# Altium schematic symbol library jlcpcb_2025_04_resistors_extended_0201.schlib: 1508 symbols (part 1 of 8) (continued)
## 0201WMF1502TEE
designator R?  Resistance: 15kΩ  (hidden comment: *)
Resistor, 15kΩ, ±1%, 50mW, 25V, ±200ppm/℃, -55℃~+155℃, SMD 0201; Manufacturer: Uniroyal; Manufacturer Part Number: 0201WMF1502TEE; Supplier 1: LCSC; Supplier Part Number 1: C473452; JLCPCB Part Number: C473452; Power Rating: 50mW; Category: Resistors; Package Size: 0201; JLCPCB Basic Part: Yes; Tolerance: ±1%; Voltage Rating: 25V; Temperature Coefficient: ±200ppm/℃; Temperature Rating: -55℃~+155℃; ComponentLink1Description: Datasheet; ComponentLink1URL: https://wmsc.lcsc.com/wmsc/upload/file/pdf/v2/lcsc/2205312145_UNI-ROYAL-Uniroyal-Elec-0201WMF1502TEE_C473452.pdf; ComponentLink2Description: JLCPCB Part URL; ComponentLink2URL: https://jlcpcb.com/partdetail/C473452
pins: 1, 2
1 alternate drawing of the same symbol

## 0201WMF1503TEE
designator R?  Resistance: 150kΩ  (hidden comment: *)
Resistor, 150kΩ, ±1%, 50mW, 25V, ±200ppm/℃, -55℃~+155℃, SMD 0201; Manufacturer: Uniroyal; Manufacturer Part Number: 0201WMF1503TEE; Supplier 1: LCSC; Supplier Part Number 1: C473465; JLCPCB Part Number: C473465; Power Rating: 50mW; Category: Resistors; Package Size: 0201; JLCPCB Basic Part: Yes; Tolerance: ±1%; Voltage Rating: 25V; Temperature Coefficient: ±200ppm/℃; Temperature Rating: -55℃~+155℃; ComponentLink1Description: Datasheet; ComponentLink1URL: https://wmsc.lcsc.com/wmsc/upload/file/pdf/v2/lcsc/2205312145_UNI-ROYAL-Uniroyal-Elec-0201WMF1503TEE_C473465.pdf; ComponentLink2Description: JLCPCB Part URL; ComponentLink2URL: https://jlcpcb.com/partdetail/C473465
pins: 1, 2
1 alternate drawing of the same symbol

## 0201WMF1581TCE
designator R?  Resistance: 1.58kΩ  (hidden comment: *)
Resistor, 1.58kΩ, ±1%, 50mW, 25V, ±200ppm/℃, -55℃~+155℃, SMD 0201; Manufacturer: Uniroyal; Manufacturer Part Number: 0201WMF1581TCE; Supplier 1: LCSC; Supplier Part Number 1: C270790; JLCPCB Part Number: C270790; Power Rating: 50mW; Category: Resistors; Package Size: 0201; JLCPCB Basic Part: Yes; Tolerance: ±1%; Voltage Rating: 25V; Temperature Coefficient: ±200ppm/℃; Temperature Rating: -55℃~+155℃; ComponentLink1Description: Datasheet; ComponentLink1URL: https://wmsc.lcsc.com/wmsc/upload/file/pdf/v2/lcsc/2205312300_UNI-ROYAL-Uniroyal-Elec-0201WMF1581TCE_C270790.pdf; ComponentLink2Description: JLCPCB Part URL; ComponentLink2URL: https://jlcpcb.com/partdetail/C270790
pins: 1, 2
1 alternate drawing of the same symbol

## 0201WMF1602TEE
designator R?  Resistance: 16000Ω  (hidden comment: *)
Resistor, 16000Ω, ±1%, 50mW, 25V, ±200ppm/℃, -55℃~+155℃, SMD 0201; Manufacturer: Uniroyal; Manufacturer Part Number: 0201WMF1602TEE; Supplier 1: LCSC; Supplier Part Number 1: C423715; JLCPCB Part Number: C423715; Power Rating: 50mW; Category: Resistors; Package Size: 0201; JLCPCB Basic Part: Yes; Tolerance: ±1%; Voltage Rating: 25V; Temperature Coefficient: ±200ppm/℃; Temperature Rating: -55℃~+155℃; ComponentLink1Description: Datasheet; ComponentLink1URL: https://wmsc.lcsc.com/wmsc/upload/file/pdf/v2/lcsc/2205312030_UNI-ROYAL-Uniroyal-Elec-0201WMF1602TEE_C423715.pdf; ComponentLink2Description: JLCPCB Part URL; ComponentLink2URL: https://jlcpcb.com/partdetail/C423715
pins: 1, 2
1 alternate drawing of the same symbol

## 0201WMF1603TEE
designator R?  Resistance: 160000Ω  (hidden comment: *)
Resistor, 160000Ω, ±1%, 50mW, 25V, ±200ppm/℃, -55℃~+155℃, SMD 0201; Manufacturer: Uniroyal; Manufacturer Part Number: 0201WMF1603TEE; Supplier 1: LCSC; Supplier Part Number 1: C423714; JLCPCB Part Number: C423714; Power Rating: 50mW; Category: Resistors; Package Size: 0201; JLCPCB Basic Part: Yes; Tolerance: ±1%; Voltage Rating: 25V; Temperature Coefficient: ±200ppm/℃; Temperature Rating: -55℃~+155℃; ComponentLink1Description: Datasheet; ComponentLink1URL: https://wmsc.lcsc.com/wmsc/upload/file/pdf/v2/lcsc/2205312145_UNI-ROYAL-Uniroyal-Elec-0201WMF1603TEE_C423714.pdf; ComponentLink2Description: JLCPCB Part URL; ComponentLink2URL: https://jlcpcb.com/partdetail/C423714
pins: 1, 2
1 alternate drawing of the same symbol

## 0201WMF1621TEE
designator R?  Resistance: 1.62kΩ  (hidden comment: *)
Resistor, 1.62kΩ, ±1%, 50mW, 25V, ±200ppm/℃, -55℃~+155℃, SMD 0201; Manufacturer: Uniroyal; Manufacturer Part Number: 0201WMF1621TEE; Supplier 1: LCSC; Supplier Part Number 1: C423711; JLCPCB Part Number: C423711; Power Rating: 50mW; Category: Resistors; Package Size: 0201; JLCPCB Basic Part: Yes; Tolerance: ±1%; Voltage Rating: 25V; Temperature Coefficient: ±200ppm/℃; Temperature Rating: -55℃~+155℃; ComponentLink1Description: Datasheet; ComponentLink1URL: https://wmsc.lcsc.com/wmsc/upload/file/pdf/v2/lcsc/2205312145_UNI-ROYAL-Uniroyal-Elec-0201WMF1621TEE_C423711.pdf; ComponentLink2Description: JLCPCB Part URL; ComponentLink2URL: https://jlcpcb.com/partdetail/C423711
pins: 1, 2
1 alternate drawing of the same symbol

## 0201WMF1622TEE
designator R?  Resistance: 16.2kΩ  (hidden comment: *)
Resistor, 16.2kΩ, ±1%, 50mW, 25V, ±200ppm/℃, -55℃~+155℃, SMD 0201; Manufacturer: Uniroyal; Manufacturer Part Number: 0201WMF1622TEE; Supplier 1: LCSC; Supplier Part Number 1: C784128; JLCPCB Part Number: C784128; Power Rating: 50mW; Category: Resistors; Package Size: 0201; JLCPCB Basic Part: Yes; Tolerance: ±1%; Voltage Rating: 25V; Temperature Coefficient: ±200ppm/℃; Temperature Rating: -55℃~+155℃; ComponentLink1Description: Datasheet; ComponentLink1URL: https://wmsc.lcsc.com/wmsc/upload/file/pdf/v2/lcsc/2205312045_UNI-ROYAL-Uniroyal-Elec-0201WMF1622TEE_C784128.pdf; ComponentLink2Description: JLCPCB Part URL; ComponentLink2URL: https://jlcpcb.com/partdetail/C784128
pins: 1, 2
1 alternate drawing of the same symbol

## 0201WMF1624TEE
designator R?  Resistance: 1.62MΩ  (hidden comment: *)
Resistor, 1.62MΩ, ±1%, 50mW, 25V, ±200ppm/℃, -55℃~+155℃, SMD 0201; Manufacturer: Uniroyal; Manufacturer Part Number: 0201WMF1624TEE; Supplier 1: LCSC; Supplier Part Number 1: C423710; JLCPCB Part Number: C423710; Power Rating: 50mW; Category: Resistors; Package Size: 0201; JLCPCB Basic Part: Yes; Tolerance: ±1%; Voltage Rating: 25V; Temperature Coefficient: ±200ppm/℃; Temperature Rating: -55℃~+155℃; ComponentLink1Description: Datasheet; ComponentLink1URL: https://wmsc.lcsc.com/wmsc/upload/file/pdf/v2/lcsc/2205312030_UNI-ROYAL-Uniroyal-Elec-0201WMF1624TEE_C423710.pdf; ComponentLink2Description: JLCPCB Part URL; ComponentLink2URL: https://jlcpcb.com/partdetail/C423710
pins: 1, 2
1 alternate drawing of the same symbol

## 0201WMF1651TEE
designator R?  Resistance: 1.65kΩ  (hidden comment: *)
Resistor, 1.65kΩ, ±1%, 50mW, 25V, ±200ppm/℃, -55℃~+155℃, SMD 0201; Manufacturer: Uniroyal; Manufacturer Part Number: 0201WMF1651TEE; Supplier 1: LCSC; Supplier Part Number 1: C423707; JLCPCB Part Number: C423707; Power Rating: 50mW; Category: Resistors; Package Size: 0201; JLCPCB Basic Part: Yes; Tolerance: ±1%; Voltage Rating: 25V; Temperature Coefficient: ±200ppm/℃; Temperature Rating: -55℃~+155℃; ComponentLink1Description: Datasheet; ComponentLink1URL: https://wmsc.lcsc.com/wmsc/upload/file/pdf/v2/lcsc/2205312030_UNI-ROYAL-Uniroyal-Elec-0201WMF1651TEE_C423707.pdf; ComponentLink2Description: JLCPCB Part URL; ComponentLink2URL: https://jlcpcb.com/partdetail/C423707
pins: 1, 2
1 alternate drawing of the same symbol

## 0201WMF1691TEE
designator R?  Resistance: 1.69kΩ  (hidden comment: *)
Resistor, 1.69kΩ, ±1%, 50mW, 25V, ±200ppm/℃, -55℃~+155℃, SMD 0201; Manufacturer: Uniroyal; Manufacturer Part Number: 0201WMF1691TEE; Supplier 1: LCSC; Supplier Part Number 1: C423702; JLCPCB Part Number: C423702; Power Rating: 50mW; Category: Resistors; Package Size: 0201; JLCPCB Basic Part: Yes; Tolerance: ±1%; Voltage Rating: 25V; Temperature Coefficient: ±200ppm/℃; Temperature Rating: -55℃~+155℃; ComponentLink1Description: Datasheet; ComponentLink1URL: https://wmsc.lcsc.com/wmsc/upload/file/pdf/v2/lcsc/2205312145_UNI-ROYAL-Uniroyal-Elec-0201WMF1691TEE_C423702.pdf; ComponentLink2Description: JLCPCB Part URL; ComponentLink2URL: https://jlcpcb.com/partdetail/C423702
pins: 1, 2
1 alternate drawing of the same symbol

## 0201WMF1741TEE
designator R?  Resistance: 1.74kΩ  (hidden comment: *)
Resistor, 1.74kΩ, ±1%, 50mW, 25V, -55℃~+155℃, SMD 0201; Manufacturer: Uniroyal; Manufacturer Part Number: 0201WMF1741TEE; Supplier 1: LCSC; Supplier Part Number 1: C423697; JLCPCB Part Number: C423697; Power Rating: 50mW; Category: Resistors; Package Size: 0201; JLCPCB Basic Part: Yes; Tolerance: ±1%; Voltage Rating: 25V; Temperature Rating: -55℃~+155℃; ComponentLink1Description: Datasheet; ComponentLink1URL: https://wmsc.lcsc.com/wmsc/upload/file/pdf/v2/lcsc/2306071622_UNI-ROYAL-Uniroyal-Elec-0201WMF1741TEE_C423697.pdf; ComponentLink2Description: JLCPCB Part URL; ComponentLink2URL: https://jlcpcb.com/partdetail/C423697
pins: 1, 2
1 alternate drawing of the same symbol

## 0201WMF1743TEE
designator R?  Resistance: 174kΩ  (hidden comment: *)
Resistor, 174kΩ, ±1%, 50mW, 25V, ±200ppm/℃, -55℃~+155℃, SMD 0201; Manufacturer: Uniroyal; Manufacturer Part Number: 0201WMF1743TEE; Supplier 1: LCSC; Supplier Part Number 1: C474246; JLCPCB Part Number: C474246; Power Rating: 50mW; Category: Resistors; Package Size: 0201; JLCPCB Basic Part: Yes; Tolerance: ±1%; Voltage Rating: 25V; Temperature Coefficient: ±200ppm/℃; Temperature Rating: -55℃~+155℃; ComponentLink1Description: Datasheet; ComponentLink1URL: https://wmsc.lcsc.com/wmsc/upload/file/pdf/v2/lcsc/2205312045_UNI-ROYAL-Uniroyal-Elec-0201WMF1743TEE_C474246.pdf; ComponentLink2Description: JLCPCB Part URL; ComponentLink2URL: https://jlcpcb.com/partdetail/C474246
pins: 1, 2
1 alternate drawing of the same symbol

## 0201WMF1782TEE
designator R?  Resistance: 17.8kΩ  (hidden comment: *)
Resistor, 17.8kΩ, ±1%, 50mW, 25V, ±200ppm/℃, -55℃~+155℃, SMD 0201; Manufacturer: Uniroyal; Manufacturer Part Number: 0201WMF1782TEE; Supplier 1: LCSC; Supplier Part Number 1: C474125; JLCPCB Part Number: C474125; Power Rating: 50mW; Category: Resistors; Package Size: 0201; JLCPCB Basic Part: Yes; Tolerance: ±1%; Voltage Rating: 25V; Temperature Coefficient: ±200ppm/℃; Temperature Rating: -55℃~+155℃; ComponentLink1Description: Datasheet; ComponentLink1URL: https://wmsc.lcsc.com/wmsc/upload/file/pdf/v2/lcsc/2205312130_UNI-ROYAL-Uniroyal-Elec-0201WMF1782TEE_C474125.pdf; ComponentLink2Description: JLCPCB Part URL; ComponentLink2URL: https://jlcpcb.com/partdetail/C474125
pins: 1, 2
1 alternate drawing of the same symbol

## 0201WMF1783TEE
designator R?  Resistance: 178kΩ  (hidden comment: *)
Resistor, 178kΩ, ±1%, 50mW, 25V, ±200ppm/℃, -55℃~+155℃, SMD 0201; Manufacturer: Uniroyal; Manufacturer Part Number: 0201WMF1783TEE; Supplier 1: LCSC; Supplier Part Number 1: C620422; JLCPCB Part Number: C620422; Power Rating: 50mW; Category: Resistors; Package Size: 0201; JLCPCB Basic Part: Yes; Tolerance: ±1%; Voltage Rating: 25V; Temperature Coefficient: ±200ppm/℃; Temperature Rating: -55℃~+155℃; ComponentLink1Description: Datasheet; ComponentLink1URL: https://wmsc.lcsc.com/wmsc/upload/file/pdf/v2/lcsc/2205311830_UNI-ROYAL-Uniroyal-Elec-0201WMF1783TEE_C620422.pdf; ComponentLink2Description: JLCPCB Part URL; ComponentLink2URL: https://jlcpcb.com/partdetail/C620422
pins: 1, 2
1 alternate drawing of the same symbol

## 0201WMF1801TEE
designator R?  Resistance: 1.8kΩ  (hidden comment: *)
Resistor, 1.8kΩ, ±1%, 50mW, 25V, ±200ppm/℃, -55℃~+155℃, SMD 0201; Manufacturer: Uniroyal; Manufacturer Part Number: 0201WMF1801TEE; Supplier 1: LCSC; Supplier Part Number 1: C473568; JLCPCB Part Number: C473568; Power Rating: 50mW; Category: Resistors; Package Size: 0201; JLCPCB Basic Part: Yes; Tolerance: ±1%; Voltage Rating: 25V; Temperature Coefficient: ±200ppm/℃; Temperature Rating: -55℃~+155℃; ComponentLink1Description: Datasheet; ComponentLink1URL: https://wmsc.lcsc.com/wmsc/upload/file/pdf/v2/lcsc/2205312145_UNI-ROYAL-Uniroyal-Elec-0201WMF1801TEE_C473568.pdf; ComponentLink2Description: JLCPCB Part URL; ComponentLink2URL: https://jlcpcb.com/partdetail/C473568
pins: 1, 2
1 alternate drawing of the same symbol

## 0201WMF1804TEE
designator R?  Resistance: 1.8MΩ  (hidden comment: *)
Resistor, 1.8MΩ, ±1%, 50mW, 25V, ±200ppm/℃, -55℃~+155℃, SMD 0201; Manufacturer: Uniroyal; Manufacturer Part Number: 0201WMF1804TEE; Supplier 1: LCSC; Supplier Part Number 1: C474151; JLCPCB Part Number: C474151; Power Rating: 50mW; Category: Resistors; Package Size: 0201; JLCPCB Basic Part: Yes; Tolerance: ±1%; Voltage Rating: 25V; Temperature Coefficient: ±200ppm/℃; Temperature Rating: -55℃~+155℃; ComponentLink1Description: Datasheet; ComponentLink1URL: https://wmsc.lcsc.com/wmsc/upload/file/pdf/v2/lcsc/2205312130_UNI-ROYAL-Uniroyal-Elec-0201WMF1804TEE_C474151.pdf; ComponentLink2Description: JLCPCB Part URL; ComponentLink2URL: https://jlcpcb.com/partdetail/C474151
pins: 1, 2
1 alternate drawing of the same symbol

## 0201WMF1822TEE
designator R?  Resistance: 18.2kΩ  (hidden comment: *)
Resistor, 18.2kΩ, ±1%, 50mW, 25V, ±200ppm/℃, -55℃~+155℃, SMD 0201; Manufacturer: Uniroyal; Manufacturer Part Number: 0201WMF1822TEE; Supplier 1: LCSC; Supplier Part Number 1: C423688; JLCPCB Part Number: C423688; Power Rating: 50mW; Category: Resistors; Package Size: 0201; JLCPCB Basic Part: Yes; Tolerance: ±1%; Voltage Rating: 25V; Temperature Coefficient: ±200ppm/℃; Temperature Rating: -55℃~+155℃; ComponentLink1Description: Datasheet; ComponentLink1URL: https://wmsc.lcsc.com/wmsc/upload/file/pdf/v2/lcsc/2205312145_UNI-ROYAL-Uniroyal-Elec-0201WMF1822TEE_C423688.pdf; ComponentLink2Description: JLCPCB Part URL; ComponentLink2URL: https://jlcpcb.com/partdetail/C423688
pins: 1, 2
1 alternate drawing of the same symbol

## 0201WMF1824TEE
designator R?  Resistance: 1.82MΩ  (hidden comment: *)
Resistor, 1.82MΩ, ±1%, 50mW, 25V, ±200ppm/℃, -55℃~+155℃, SMD 0201; Manufacturer: Uniroyal; Manufacturer Part Number: 0201WMF1824TEE; Supplier 1: LCSC; Supplier Part Number 1: C784131; JLCPCB Part Number: C784131; Power Rating: 50mW; Category: Resistors; Package Size: 0201; JLCPCB Basic Part: Yes; Tolerance: ±1%; Voltage Rating: 25V; Temperature Coefficient: ±200ppm/℃; Temperature Rating: -55℃~+155℃; ComponentLink1Description: Datasheet; ComponentLink1URL: https://wmsc.lcsc.com/wmsc/upload/file/pdf/v2/lcsc/2205312045_UNI-ROYAL-Uniroyal-Elec-0201WMF1824TEE_C784131.pdf; ComponentLink2Description: JLCPCB Part URL; ComponentLink2URL: https://jlcpcb.com/partdetail/C784131
pins: 1, 2
1 alternate drawing of the same symbol

## 0201WMF1872TEE
designator R?  Resistance: 18700Ω  (hidden comment: *)
Resistor, 18700Ω, ±1%, 50mW, 25V, -55℃~+155℃, SMD 0201; Manufacturer: Uniroyal; Manufacturer Part Number: 0201WMF1872TEE; Supplier 1: LCSC; Supplier Part Number 1: C423682; JLCPCB Part Number: C423682; Power Rating: 50mW; Category: Resistors; Package Size: 0201; JLCPCB Basic Part: Yes; Tolerance: ±1%; Voltage Rating: 25V; Temperature Rating: -55℃~+155℃; ComponentLink1Description: Datasheet; ComponentLink1URL: https://wmsc.lcsc.com/wmsc/upload/file/pdf/v2/lcsc/2207141800_UNI-ROYAL-Uniroyal-Elec-0201WMF1872TEE_C423682.pdf; ComponentLink2Description: JLCPCB Part URL; ComponentLink2URL: https://jlcpcb.com/partdetail/C423682
pins: 1, 2
1 alternate drawing of the same symbol

## 0201WMF1873TCE
designator R?  Resistance: 187kΩ  (hidden comment: *)
Resistor, 187kΩ, ±1%, 50mW, 25V, ±200ppm/℃, -55℃~+155℃, SMD 0201; Manufacturer: Uniroyal; Manufacturer Part Number: 0201WMF1873TCE; Supplier 1: LCSC; Supplier Part Number 1: C60260; JLCPCB Part Number: C60260; Power Rating: 50mW; Category: Resistors; Package Size: 0201; JLCPCB Basic Part: Yes; Tolerance: ±1%; Voltage Rating: 25V; Temperature Coefficient: ±200ppm/℃; Temperature Rating: -55℃~+155℃; ComponentLink1Description: Datasheet; ComponentLink1URL: https://wmsc.lcsc.com/wmsc/upload/file/pdf/v2/lcsc/2304140030_UNI-ROYAL-Uniroyal-Elec-0201WMF1873TCE_C60260.pdf; ComponentLink2Description: JLCPCB Part URL; ComponentLink2URL: https://jlcpcb.com/partdetail/C60260
pins: 1, 2
1 alternate drawing of the same symbol

## 0201WMF1873TEE
designator R?  Resistance: 187kΩ  (hidden comment: *)
Resistor, 187kΩ, ±1%, 50mW, 25V, ±200ppm/℃, -55℃~+155℃, SMD 0201; Manufacturer: Uniroyal; Manufacturer Part Number: 0201WMF1873TEE; Supplier 1: LCSC; Supplier Part Number 1: C423681; JLCPCB Part Number: C423681; Power Rating: 50mW; Category: Resistors; Package Size: 0201; JLCPCB Basic Part: Yes; Tolerance: ±1%; Voltage Rating: 25V; Temperature Coefficient: ±200ppm/℃; Temperature Rating: -55℃~+155℃; ComponentLink1Description: Datasheet; ComponentLink1URL: https://wmsc.lcsc.com/wmsc/upload/file/pdf/v2/lcsc/2205312145_UNI-ROYAL-Uniroyal-Elec-0201WMF1873TEE_C423681.pdf; ComponentLink2Description: JLCPCB Part URL; ComponentLink2URL: https://jlcpcb.com/partdetail/C423681
pins: 1, 2
1 alternate drawing of the same symbol

## 0201WMF1912TEE
designator R?  Resistance: 19.1kΩ  (hidden comment: *)
Resistor, 19.1kΩ, ±1%, 50mW, 25V, ±200ppm/℃, -55℃~+155℃, SMD 0201; Manufacturer: Uniroyal; Manufacturer Part Number: 0201WMF1912TEE; Supplier 1: LCSC; Supplier Part Number 1: C474284; JLCPCB Part Number: C474284; Power Rating: 50mW; Category: Resistors; Package Size: 0201; JLCPCB Basic Part: Yes; Tolerance: ±1%; Voltage Rating: 25V; Temperature Coefficient: ±200ppm/℃; Temperature Rating: -55℃~+155℃; ComponentLink1Description: Datasheet; ComponentLink1URL: https://wmsc.lcsc.com/wmsc/upload/file/pdf/v2/lcsc/2205312045_UNI-ROYAL-Uniroyal-Elec-0201WMF1912TEE_C474284.pdf; ComponentLink2Description: JLCPCB Part URL; ComponentLink2URL: https://jlcpcb.com/partdetail/C474284
pins: 1, 2
1 alternate drawing of the same symbol

## 0201WMF1961TEE
designator R?  Resistance: 1.96kΩ  (hidden comment: *)
Resistor, 1.96kΩ, ±1%, 50mW, 25V, ±200ppm/℃, -55℃~+155℃, SMD 0201; Manufacturer: Uniroyal; Manufacturer Part Number: 0201WMF1961TEE; Supplier 1: LCSC; Supplier Part Number 1: C423676; JLCPCB Part Number: C423676; Power Rating: 50mW; Category: Resistors; Package Size: 0201; JLCPCB Basic Part: Yes; Tolerance: ±1%; Voltage Rating: 25V; Temperature Coefficient: ±200ppm/℃; Temperature Rating: -55℃~+155℃; ComponentLink1Description: Datasheet; ComponentLink1URL: https://wmsc.lcsc.com/wmsc/upload/file/pdf/v2/lcsc/2205312145_UNI-ROYAL-Uniroyal-Elec-0201WMF1961TEE_C423676.pdf; ComponentLink2Description: JLCPCB Part URL; ComponentLink2URL: https://jlcpcb.com/partdetail/C423676
pins: 1, 2
1 alternate drawing of the same symbol

## 0201WMF1962TEE
designator R?  Resistance: 19.6kΩ  (hidden comment: *)
Resistor, 19.6kΩ, ±1%, 50mW, 25V, ±200ppm/℃, -55℃~+155℃, SMD 0201; Manufacturer: Uniroyal; Manufacturer Part Number: 0201WMF1962TEE; Supplier 1: LCSC; Supplier Part Number 1: C423675; JLCPCB Part Number: C423675; Power Rating: 50mW; Category: Resistors; Package Size: 0201; JLCPCB Basic Part: Yes; Tolerance: ±1%; Voltage Rating: 25V; Temperature Coefficient: ±200ppm/℃; Temperature Rating: -55℃~+155℃; ComponentLink1Description: Datasheet; ComponentLink1URL: https://wmsc.lcsc.com/wmsc/upload/file/pdf/v2/lcsc/2205312145_UNI-ROYAL-Uniroyal-Elec-0201WMF1962TEE_C423675.pdf; ComponentLink2Description: JLCPCB Part URL; ComponentLink2URL: https://jlcpcb.com/partdetail/C423675
pins: 1, 2
1 alternate drawing of the same symbol

## 0201WMF2000TEE
designator R?  Resistance: 200Ω  (hidden comment: *)
Resistor, 200Ω, ±1%, 50mW, 25V, ±200ppm/℃, -55℃~+155℃, SMD 0201; Manufacturer: Uniroyal; Manufacturer Part Number: 0201WMF2000TEE; Supplier 1: LCSC; Supplier Part Number 1: C270359; JLCPCB Part Number: C270359; Power Rating: 50mW; Category: Resistors; Package Size: 0201; JLCPCB Basic Part: Yes; Tolerance: ±1%; Voltage Rating: 25V; Temperature Coefficient: ±200ppm/℃; Temperature Rating: -55℃~+155℃; ComponentLink1Description: Datasheet; ComponentLink1URL: https://wmsc.lcsc.com/wmsc/upload/file/pdf/v2/lcsc/2205311945_UNI-ROYAL-Uniroyal-Elec-0201WMF2000TEE_C270359.pdf; ComponentLink2Description: JLCPCB Part URL; ComponentLink2URL: https://jlcpcb.com/partdetail/C270359
pins: 1, 2
1 alternate drawing of the same symbol

## 0201WMF2001TEE
designator R?  Resistance: 2kΩ  (hidden comment: *)
Resistor, 2kΩ, ±1%, 50mW, 25V, ±200ppm/℃, -55℃~+155℃, SMD 0201; Manufacturer: Uniroyal; Manufacturer Part Number: 0201WMF2001TEE; Supplier 1: LCSC; Supplier Part Number 1: C270358; JLCPCB Part Number: C270358; Power Rating: 50mW; Category: Resistors; Package Size: 0201; JLCPCB Basic Part: Yes; Tolerance: ±1%; Voltage Rating: 25V; Temperature Coefficient: ±200ppm/℃; Temperature Rating: -55℃~+155℃; ComponentLink1Description: Datasheet; ComponentLink1URL: https://wmsc.lcsc.com/wmsc/upload/file/pdf/v2/lcsc/2205311945_UNI-ROYAL-Uniroyal-Elec-0201WMF2001TEE_C270358.pdf; ComponentLink2Description: JLCPCB Part URL; ComponentLink2URL: https://jlcpcb.com/partdetail/C270358
pins: 1, 2
1 alternate drawing of the same symbol

## 0201WMF2002TEE
designator R?  Resistance: 20kΩ  (hidden comment: *)
Resistor, 20kΩ, ±1%, 50mW, 25V, ±200ppm/℃, -55℃~+155℃, SMD 0201; Manufacturer: Uniroyal; Manufacturer Part Number: 0201WMF2002TEE; Supplier 1: LCSC; Supplier Part Number 1: C473466; JLCPCB Part Number: C473466; Power Rating: 50mW; Category: Resistors; Package Size: 0201; JLCPCB Basic Part: Yes; Tolerance: ±1%; Voltage Rating: 25V; Temperature Coefficient: ±200ppm/℃; Temperature Rating: -55℃~+155℃; ComponentLink1Description: Datasheet; ComponentLink1URL: https://wmsc.lcsc.com/wmsc/upload/file/pdf/v2/lcsc/2205312145_UNI-ROYAL-Uniroyal-Elec-0201WMF2002TEE_C473466.pdf; ComponentLink2Description: JLCPCB Part URL; ComponentLink2URL: https://jlcpcb.com/partdetail/C473466
pins: 1, 2
1 alternate drawing of the same symbol

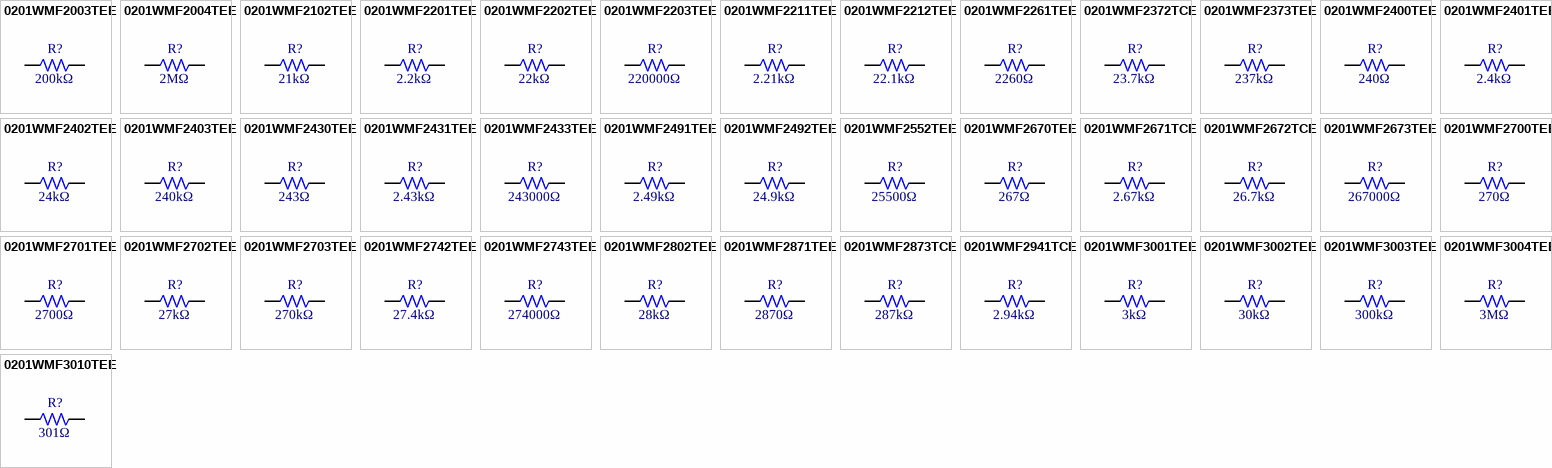
[diagram p3: symbols 0201WMF2003TEE to 0201WMF3010TEE]

## 0201WMF2003TEE
designator R?  Resistance: 200kΩ  (hidden comment: *)
Resistor, 200kΩ, ±1%, 50mW, 25V, ±200ppm/℃, -55℃~+155℃, SMD 0201; Manufacturer: Uniroyal; Manufacturer Part Number: 0201WMF2003TEE; Supplier 1: LCSC; Supplier Part Number 1: C270357; JLCPCB Part Number: C270357; Power Rating: 50mW; Category: Resistors; Package Size: 0201; JLCPCB Basic Part: Yes; Tolerance: ±1%; Voltage Rating: 25V; Temperature Coefficient: ±200ppm/℃; Temperature Rating: -55℃~+155℃; ComponentLink1Description: Datasheet; ComponentLink1URL: https://wmsc.lcsc.com/wmsc/upload/file/pdf/v2/lcsc/2205311945_UNI-ROYAL-Uniroyal-Elec-0201WMF2003TEE_C270357.pdf; ComponentLink2Description: JLCPCB Part URL; ComponentLink2URL: https://jlcpcb.com/partdetail/C270357
pins: 1, 2
1 alternate drawing of the same symbol

## 0201WMF2004TEE
designator R?  Resistance: 2MΩ  (hidden comment: *)
Resistor, 2MΩ, ±1%, 50mW, 25V, ±200ppm/℃, -55℃~+155℃, SMD 0201; Manufacturer: Uniroyal; Manufacturer Part Number: 0201WMF2004TEE; Supplier 1: LCSC; Supplier Part Number 1: C473556; JLCPCB Part Number: C473556; Power Rating: 50mW; Category: Resistors; Package Size: 0201; JLCPCB Basic Part: Yes; Tolerance: ±1%; Voltage Rating: 25V; Temperature Coefficient: ±200ppm/℃; Temperature Rating: -55℃~+155℃; ComponentLink1Description: Datasheet; ComponentLink1URL: https://wmsc.lcsc.com/wmsc/upload/file/pdf/v2/lcsc/2205312145_UNI-ROYAL-Uniroyal-Elec-0201WMF2004TEE_C473556.pdf; ComponentLink2Description: JLCPCB Part URL; ComponentLink2URL: https://jlcpcb.com/partdetail/C473556
pins: 1, 2
1 alternate drawing of the same symbol

## 0201WMF2102TEE
designator R?  Resistance: 21kΩ  (hidden comment: *)
Resistor, 21kΩ, ±1%, 50mW, 25V, -55℃~+155℃, SMD 0201; Manufacturer: Uniroyal; Manufacturer Part Number: 0201WMF2102TEE; Supplier 1: LCSC; Supplier Part Number 1: C423668; JLCPCB Part Number: C423668; Power Rating: 50mW; Category: Resistors; Package Size: 0201; JLCPCB Basic Part: Yes; Tolerance: ±1%; Voltage Rating: 25V; Temperature Rating: -55℃~+155℃; ComponentLink1Description: Datasheet; ComponentLink1URL: https://wmsc.lcsc.com/wmsc/upload/file/pdf/v2/lcsc/2306071622_UNI-ROYAL-Uniroyal-Elec-0201WMF2102TEE_C423668.pdf; ComponentLink2Description: JLCPCB Part URL; ComponentLink2URL: https://jlcpcb.com/partdetail/C423668
pins: 1, 2
1 alternate drawing of the same symbol

## 0201WMF2201TEE
designator R?  Resistance: 2.2kΩ  (hidden comment: *)
Resistor, 2.2kΩ, ±1%, 50mW, 25V, ±200ppm/℃, -55℃~+155℃, SMD 0201; Manufacturer: Uniroyal; Manufacturer Part Number: 0201WMF2201TEE; Supplier 1: LCSC; Supplier Part Number 1: C473508; JLCPCB Part Number: C473508; Power Rating: 50mW; Category: Resistors; Package Size: 0201; JLCPCB Basic Part: Yes; Tolerance: ±1%; Voltage Rating: 25V; Temperature Coefficient: ±200ppm/℃; Temperature Rating: -55℃~+155℃; ComponentLink1Description: Datasheet; ComponentLink1URL: https://wmsc.lcsc.com/wmsc/upload/file/pdf/v2/lcsc/2205312145_UNI-ROYAL-Uniroyal-Elec-0201WMF2201TEE_C473508.pdf; ComponentLink2Description: JLCPCB Part URL; ComponentLink2URL: https://jlcpcb.com/partdetail/C473508
pins: 1, 2
1 alternate drawing of the same symbol

## 0201WMF2202TEE
designator R?  Resistance: 22kΩ  (hidden comment: *)
Resistor, 22kΩ, ±1%, 50mW, 25V, ±200ppm/℃, -55℃~+155℃, SMD 0201; Manufacturer: Uniroyal; Manufacturer Part Number: 0201WMF2202TEE; Supplier 1: LCSC; Supplier Part Number 1: C473469; JLCPCB Part Number: C473469; Power Rating: 50mW; Category: Resistors; Package Size: 0201; JLCPCB Basic Part: Yes; Tolerance: ±1%; Voltage Rating: 25V; Temperature Coefficient: ±200ppm/℃; Temperature Rating: -55℃~+155℃; ComponentLink1Description: Datasheet; ComponentLink1URL: https://wmsc.lcsc.com/wmsc/upload/file/pdf/v2/lcsc/2205312030_UNI-ROYAL-Uniroyal-Elec-0201WMF2202TEE_C473469.pdf; ComponentLink2Description: JLCPCB Part URL; ComponentLink2URL: https://jlcpcb.com/partdetail/C473469
pins: 1, 2
1 alternate drawing of the same symbol

## 0201WMF2203TEE
designator R?  Resistance: 220000Ω  (hidden comment: *)
Resistor, 220000Ω, ±1%, 50mW, 25V, ±200ppm/℃, -55℃~+155℃, SMD 0201; Manufacturer: Uniroyal; Manufacturer Part Number: 0201WMF2203TEE; Supplier 1: LCSC; Supplier Part Number 1: C473458; JLCPCB Part Number: C473458; Power Rating: 50mW; Category: Resistors; Package Size: 0201; JLCPCB Basic Part: Yes; Tolerance: ±1%; Voltage Rating: 25V; Temperature Coefficient: ±200ppm/℃; Temperature Rating: -55℃~+155℃; ComponentLink1Description: Datasheet; ComponentLink1URL: https://wmsc.lcsc.com/wmsc/upload/file/pdf/v2/lcsc/2205312145_UNI-ROYAL-Uniroyal-Elec-0201WMF2203TEE_C473458.pdf; ComponentLink2Description: JLCPCB Part URL; ComponentLink2URL: https://jlcpcb.com/partdetail/C473458
pins: 1, 2
1 alternate drawing of the same symbol

## 0201WMF2211TEE
designator R?  Resistance: 2.21kΩ  (hidden comment: *)
Resistor, 2.21kΩ, ±1%, 50mW, 25V, ±200ppm/℃, -55℃~+155℃, SMD 0201; Manufacturer: Uniroyal; Manufacturer Part Number: 0201WMF2211TEE; Supplier 1: LCSC; Supplier Part Number 1: C473931; JLCPCB Part Number: C473931; Power Rating: 50mW; Category: Resistors; Package Size: 0201; JLCPCB Basic Part: Yes; Tolerance: ±1%; Voltage Rating: 25V; Temperature Coefficient: ±200ppm/℃; Temperature Rating: -55℃~+155℃; ComponentLink1Description: Datasheet; ComponentLink1URL: https://wmsc.lcsc.com/wmsc/upload/file/pdf/v2/lcsc/2205312130_UNI-ROYAL-Uniroyal-Elec-0201WMF2211TEE_C473931.pdf; ComponentLink2Description: JLCPCB Part URL; ComponentLink2URL: https://jlcpcb.com/partdetail/C473931
pins: 1, 2
1 alternate drawing of the same symbol

## 0201WMF2212TEE
designator R?  Resistance: 22.1kΩ  (hidden comment: *)
Resistor, 22.1kΩ, ±1%, 50mW, 25V, ±200ppm/℃, -55℃~+155℃, SMD 0201; Manufacturer: Uniroyal; Manufacturer Part Number: 0201WMF2212TEE; Supplier 1: LCSC; Supplier Part Number 1: C423662; JLCPCB Part Number: C423662; Power Rating: 50mW; Category: Resistors; Package Size: 0201; JLCPCB Basic Part: Yes; Tolerance: ±1%; Voltage Rating: 25V; Temperature Coefficient: ±200ppm/℃; Temperature Rating: -55℃~+155℃; ComponentLink1Description: Datasheet; ComponentLink1URL: https://wmsc.lcsc.com/wmsc/upload/file/pdf/v2/lcsc/2205312145_UNI-ROYAL-Uniroyal-Elec-0201WMF2212TEE_C423662.pdf; ComponentLink2Description: JLCPCB Part URL; ComponentLink2URL: https://jlcpcb.com/partdetail/C423662
pins: 1, 2
1 alternate drawing of the same symbol

## 0201WMF2261TEE
designator R?  Resistance: 2260Ω  (hidden comment: *)
Resistor, 2260Ω, ±1%, 50mW, 25V, ±200ppm/℃, -55℃~+155℃, SMD 0201; Manufacturer: Uniroyal; Manufacturer Part Number: 0201WMF2261TEE; Supplier 1: LCSC; Supplier Part Number 1: C473630; JLCPCB Part Number: C473630; Power Rating: 50mW; Category: Resistors; Package Size: 0201; JLCPCB Basic Part: Yes; Tolerance: ±1%; Voltage Rating: 25V; Temperature Coefficient: ±200ppm/℃; Temperature Rating: -55℃~+155℃; ComponentLink1Description: Datasheet; ComponentLink1URL: https://wmsc.lcsc.com/wmsc/upload/file/pdf/v2/lcsc/2205312130_UNI-ROYAL-Uniroyal-Elec-0201WMF2261TEE_C473630.pdf; ComponentLink2Description: JLCPCB Part URL; ComponentLink2URL: https://jlcpcb.com/partdetail/C473630
pins: 1, 2
1 alternate drawing of the same symbol

## 0201WMF2372TCE
designator R?  Resistance: 23.7kΩ  (hidden comment: *)
Resistor, 23.7kΩ, ±1%, 50mW, 25V, ±200ppm/℃, -55℃~+155℃, SMD 0201; Manufacturer: Uniroyal; Manufacturer Part Number: 0201WMF2372TCE; Supplier 1: LCSC; Supplier Part Number 1: C270769; JLCPCB Part Number: C270769; Power Rating: 50mW; Category: Resistors; Package Size: 0201; JLCPCB Basic Part: Yes; Tolerance: ±1%; Voltage Rating: 25V; Temperature Coefficient: ±200ppm/℃; Temperature Rating: -55℃~+155℃; ComponentLink1Description: Datasheet; ComponentLink1URL: https://wmsc.lcsc.com/wmsc/upload/file/pdf/v2/lcsc/2205311945_UNI-ROYAL-Uniroyal-Elec-0201WMF2372TCE_C270769.pdf; ComponentLink2Description: JLCPCB Part URL; ComponentLink2URL: https://jlcpcb.com/partdetail/C270769
pins: 1, 2
1 alternate drawing of the same symbol

## 0201WMF2373TEE
designator R?  Resistance: 237kΩ  (hidden comment: *)
Resistor, 237kΩ, ±1%, 50mW, 25V, ±200ppm/℃, -55℃~+155℃, SMD 0201; Manufacturer: Uniroyal; Manufacturer Part Number: 0201WMF2373TEE; Supplier 1: LCSC; Supplier Part Number 1: C423651; JLCPCB Part Number: C423651; Power Rating: 50mW; Category: Resistors; Package Size: 0201; JLCPCB Basic Part: Yes; Tolerance: ±1%; Voltage Rating: 25V; Temperature Coefficient: ±200ppm/℃; Temperature Rating: -55℃~+155℃; ComponentLink1Description: Datasheet; ComponentLink1URL: https://wmsc.lcsc.com/wmsc/upload/file/pdf/v2/lcsc/2205312145_UNI-ROYAL-Uniroyal-Elec-0201WMF2373TEE_C423651.pdf; ComponentLink2Description: JLCPCB Part URL; ComponentLink2URL: https://jlcpcb.com/partdetail/C423651
pins: 1, 2
1 alternate drawing of the same symbol

## 0201WMF2400TEE
designator R?  Resistance: 240Ω  (hidden comment: *)
Resistor, 240Ω, ±1%, 50mW, 25V, ±200ppm/℃, -55℃~+155℃, SMD 0201; Manufacturer: Uniroyal; Manufacturer Part Number: 0201WMF2400TEE; Supplier 1: LCSC; Supplier Part Number 1: C270354; JLCPCB Part Number: C270354; Power Rating: 50mW; Category: Resistors; Package Size: 0201; JLCPCB Basic Part: Yes; Tolerance: ±1%; Voltage Rating: 25V; Temperature Coefficient: ±200ppm/℃; Temperature Rating: -55℃~+155℃; ComponentLink1Description: Datasheet; ComponentLink1URL: https://wmsc.lcsc.com/wmsc/upload/file/pdf/v2/lcsc/2205311945_UNI-ROYAL-Uniroyal-Elec-0201WMF2400TEE_C270354.pdf; ComponentLink2Description: JLCPCB Part URL; ComponentLink2URL: https://jlcpcb.com/partdetail/C270354
pins: 1, 2
1 alternate drawing of the same symbol

## 0201WMF2401TEE
designator R?  Resistance: 2.4kΩ  (hidden comment: *)
Resistor, 2.4kΩ, ±1%, 50mW, 25V, ±200ppm/℃, -55℃~+155℃, SMD 0201; Manufacturer: Uniroyal; Manufacturer Part Number: 0201WMF2401TEE; Supplier 1: LCSC; Supplier Part Number 1: C473626; JLCPCB Part Number: C473626; Power Rating: 50mW; Category: Resistors; Package Size: 0201; JLCPCB Basic Part: Yes; Tolerance: ±1%; Voltage Rating: 25V; Temperature Coefficient: ±200ppm/℃; Temperature Rating: -55℃~+155℃; ComponentLink1Description: Datasheet; ComponentLink1URL: https://wmsc.lcsc.com/wmsc/upload/file/pdf/v2/lcsc/2205312030_UNI-ROYAL-Uniroyal-Elec-0201WMF2401TEE_C473626.pdf; ComponentLink2Description: JLCPCB Part URL; ComponentLink2URL: https://jlcpcb.com/partdetail/C473626
pins: 1, 2
1 alternate drawing of the same symbol

## 0201WMF2402TEE
designator R?  Resistance: 24kΩ  (hidden comment: *)
Resistor, 24kΩ, ±1%, 50mW, 25V, ±200ppm/℃, -55℃~+155℃, SMD 0201; Manufacturer: Uniroyal; Manufacturer Part Number: 0201WMF2402TEE; Supplier 1: LCSC; Supplier Part Number 1: C270353; JLCPCB Part Number: C270353; Power Rating: 50mW; Category: Resistors; Package Size: 0201; JLCPCB Basic Part: Yes; Tolerance: ±1%; Voltage Rating: 25V; Temperature Coefficient: ±200ppm/℃; Temperature Rating: -55℃~+155℃; ComponentLink1Description: Datasheet; ComponentLink1URL: https://wmsc.lcsc.com/wmsc/upload/file/pdf/v2/lcsc/2205311945_UNI-ROYAL-Uniroyal-Elec-0201WMF2402TEE_C270353.pdf; ComponentLink2Description: JLCPCB Part URL; ComponentLink2URL: https://jlcpcb.com/partdetail/C270353
pins: 1, 2
1 alternate drawing of the same symbol

## 0201WMF2403TEE
designator R?  Resistance: 240kΩ  (hidden comment: *)
Resistor, 240kΩ, ±1%, 50mW, 25V, ±200ppm/℃, -55℃~+155℃, SMD 0201; Manufacturer: Uniroyal; Manufacturer Part Number: 0201WMF2403TEE; Supplier 1: LCSC; Supplier Part Number 1: C516472; JLCPCB Part Number: C516472; Power Rating: 50mW; Category: Resistors; Package Size: 0201; JLCPCB Basic Part: Yes; Tolerance: ±1%; Voltage Rating: 25V; Temperature Coefficient: ±200ppm/℃; Temperature Rating: -55℃~+155℃; ComponentLink1Description: Datasheet; ComponentLink1URL: https://wmsc.lcsc.com/wmsc/upload/file/pdf/v2/lcsc/2205312030_UNI-ROYAL-Uniroyal-Elec-0201WMF2403TEE_C516472.pdf; ComponentLink2Description: JLCPCB Part URL; ComponentLink2URL: https://jlcpcb.com/partdetail/C516472
pins: 1, 2
1 alternate drawing of the same symbol

## 0201WMF2430TEE
designator R?  Resistance: 243Ω  (hidden comment: *)
Resistor, 243Ω, ±1%, 50mW, 25V, ±200ppm/℃, -55℃~+155℃, SMD 0201; Manufacturer: Uniroyal; Manufacturer Part Number: 0201WMF2430TEE; Supplier 1: LCSC; Supplier Part Number 1: C778423; JLCPCB Part Number: C778423; Power Rating: 50mW; Category: Resistors; Package Size: 0201; JLCPCB Basic Part: Yes; Tolerance: ±1%; Voltage Rating: 25V; Temperature Coefficient: ±200ppm/℃; Temperature Rating: -55℃~+155℃; ComponentLink1Description: Datasheet; ComponentLink1URL: https://wmsc.lcsc.com/wmsc/upload/file/pdf/v2/lcsc/2205312045_UNI-ROYAL-Uniroyal-Elec-0201WMF2430TEE_C778423.pdf; ComponentLink2Description: JLCPCB Part URL; ComponentLink2URL: https://jlcpcb.com/partdetail/C778423
pins: 1, 2
1 alternate drawing of the same symbol

## 0201WMF2431TEE
designator R?  Resistance: 2.43kΩ  (hidden comment: *)
Resistor, 2.43kΩ, ±1%, 50mW, 25V, ±200ppm/℃, -55℃~+155℃, SMD 0201; Manufacturer: Uniroyal; Manufacturer Part Number: 0201WMF2431TEE; Supplier 1: LCSC; Supplier Part Number 1: C423646; JLCPCB Part Number: C423646; Power Rating: 50mW; Category: Resistors; Package Size: 0201; JLCPCB Basic Part: Yes; Tolerance: ±1%; Voltage Rating: 25V; Temperature Coefficient: ±200ppm/℃; Temperature Rating: -55℃~+155℃; ComponentLink1Description: Datasheet; ComponentLink1URL: https://wmsc.lcsc.com/wmsc/upload/file/pdf/v2/lcsc/2205312145_UNI-ROYAL-Uniroyal-Elec-0201WMF2431TEE_C423646.pdf; ComponentLink2Description: JLCPCB Part URL; ComponentLink2URL: https://jlcpcb.com/partdetail/C423646
pins: 1, 2
1 alternate drawing of the same symbol

## 0201WMF2433TEE
designator R?  Resistance: 243000Ω  (hidden comment: *)
Resistor, 243000Ω, ±1%, 50mW, 25V, ±200ppm/℃, -55℃~+155℃, SMD 0201; Manufacturer: Uniroyal; Manufacturer Part Number: 0201WMF2433TEE; Supplier 1: LCSC; Supplier Part Number 1: C423644; JLCPCB Part Number: C423644; Power Rating: 50mW; Category: Resistors; Package Size: 0201; JLCPCB Basic Part: Yes; Tolerance: ±1%; Voltage Rating: 25V; Temperature Coefficient: ±200ppm/℃; Temperature Rating: -55℃~+155℃; ComponentLink1Description: Datasheet; ComponentLink1URL: https://wmsc.lcsc.com/wmsc/upload/file/pdf/v2/lcsc/2206011100_UNI-ROYAL-Uniroyal-Elec-0201WMF2433TEE_C423644.pdf; ComponentLink2Description: JLCPCB Part URL; ComponentLink2URL: https://jlcpcb.com/partdetail/C423644
pins: 1, 2
1 alternate drawing of the same symbol

## 0201WMF2491TEE
designator R?  Resistance: 2.49kΩ  (hidden comment: *)
Resistor, 2.49kΩ, ±1%, 50mW, 25V, ±200ppm/℃, -55℃~+155℃, SMD 0201; Manufacturer: Uniroyal; Manufacturer Part Number: 0201WMF2491TEE; Supplier 1: LCSC; Supplier Part Number 1: C473476; JLCPCB Part Number: C473476; Power Rating: 50mW; Category: Resistors; Package Size: 0201; JLCPCB Basic Part: Yes; Tolerance: ±1%; Voltage Rating: 25V; Temperature Coefficient: ±200ppm/℃; Temperature Rating: -55℃~+155℃; ComponentLink1Description: Datasheet; ComponentLink1URL: https://wmsc.lcsc.com/wmsc/upload/file/pdf/v2/lcsc/2205312145_UNI-ROYAL-Uniroyal-Elec-0201WMF2491TEE_C473476.pdf; ComponentLink2Description: JLCPCB Part URL; ComponentLink2URL: https://jlcpcb.com/partdetail/C473476
pins: 1, 2
1 alternate drawing of the same symbol

## 0201WMF2492TEE
designator R?  Resistance: 24.9kΩ  (hidden comment: *)
Resistor, 24.9kΩ, ±1%, 50mW, 25V, ±200ppm/℃, -55℃~+155℃, SMD 0201; Manufacturer: Uniroyal; Manufacturer Part Number: 0201WMF2492TEE; Supplier 1: LCSC; Supplier Part Number 1: C474183; JLCPCB Part Number: C474183; Power Rating: 50mW; Category: Resistors; Package Size: 0201; JLCPCB Basic Part: Yes; Tolerance: ±1%; Voltage Rating: 25V; Temperature Coefficient: ±200ppm/℃; Temperature Rating: -55℃~+155℃; ComponentLink1Description: Datasheet; ComponentLink1URL: https://wmsc.lcsc.com/wmsc/upload/file/pdf/v2/lcsc/2205312045_UNI-ROYAL-Uniroyal-Elec-0201WMF2492TEE_C474183.pdf; ComponentLink2Description: JLCPCB Part URL; ComponentLink2URL: https://jlcpcb.com/partdetail/C474183
pins: 1, 2
1 alternate drawing of the same symbol

## 0201WMF2552TEE
designator R?  Resistance: 25500Ω  (hidden comment: *)
Resistor, 25500Ω, ±1%, 50mW, 25V, ±200ppm/℃, -55℃~+155℃, SMD 0201; Manufacturer: Uniroyal; Manufacturer Part Number: 0201WMF2552TEE; Supplier 1: LCSC; Supplier Part Number 1: C423637; JLCPCB Part Number: C423637; Power Rating: 50mW; Category: Resistors; Package Size: 0201; JLCPCB Basic Part: Yes; Tolerance: ±1%; Voltage Rating: 25V; Temperature Coefficient: ±200ppm/℃; Temperature Rating: -55℃~+155℃; ComponentLink1Description: Datasheet; ComponentLink1URL: https://wmsc.lcsc.com/wmsc/upload/file/pdf/v2/lcsc/2205312145_UNI-ROYAL-Uniroyal-Elec-0201WMF2552TEE_C423637.pdf; ComponentLink2Description: JLCPCB Part URL; ComponentLink2URL: https://jlcpcb.com/partdetail/C423637
pins: 1, 2
1 alternate drawing of the same symbol

## 0201WMF2670TEE
designator R?  Resistance: 267Ω  (hidden comment: *)
Resistor, 267Ω, ±1%, 50mW, 25V, ±200ppm/℃, -55℃~+155℃, SMD 0201; Manufacturer: Uniroyal; Manufacturer Part Number: 0201WMF2670TEE; Supplier 1: LCSC; Supplier Part Number 1: C423629; JLCPCB Part Number: C423629; Power Rating: 50mW; Category: Resistors; Package Size: 0201; JLCPCB Basic Part: Yes; Tolerance: ±1%; Voltage Rating: 25V; Temperature Coefficient: ±200ppm/℃; Temperature Rating: -55℃~+155℃; ComponentLink1Description: Datasheet; ComponentLink1URL: https://wmsc.lcsc.com/wmsc/upload/file/pdf/v2/lcsc/2205312145_UNI-ROYAL-Uniroyal-Elec-0201WMF2670TEE_C423629.pdf; ComponentLink2Description: JLCPCB Part URL; ComponentLink2URL: https://jlcpcb.com/partdetail/C423629
pins: 1, 2
1 alternate drawing of the same symbol

## 0201WMF2671TCE
designator R?  Resistance: 2.67kΩ  (hidden comment: *)
Resistor, 2.67kΩ, ±1%, 50mW, 25V, ±200ppm/℃, -55℃~+155℃, SMD 0201; Manufacturer: Uniroyal; Manufacturer Part Number: 0201WMF2671TCE; Supplier 1: LCSC; Supplier Part Number 1: C246966; JLCPCB Part Number: C246966; Power Rating: 50mW; Category: Resistors; Package Size: 0201; JLCPCB Basic Part: Yes; Tolerance: ±1%; Voltage Rating: 25V; Temperature Coefficient: ±200ppm/℃; Temperature Rating: -55℃~+155℃; ComponentLink1Description: Datasheet; ComponentLink1URL: https://wmsc.lcsc.com/wmsc/upload/file/pdf/v2/lcsc/2205311916_UNI-ROYAL-Uniroyal-Elec-0201WMF2671TCE_C246966.pdf; ComponentLink2Description: JLCPCB Part URL; ComponentLink2URL: https://jlcpcb.com/partdetail/C246966
pins: 1, 2
1 alternate drawing of the same symbol
